# Altium footprint library En.PcbLib: 157 footprints (part 1 of 10)
Each footprint in its own frame and in the unit in brackets; x right, y up, seen from the top. Pads: shape width x height; smd on the part's side, far side on the other; paste and mask are expansions set on the pad; w line width, h text height; cw(c..) or ccw(c..) is an arc to the next point about the centre after c.
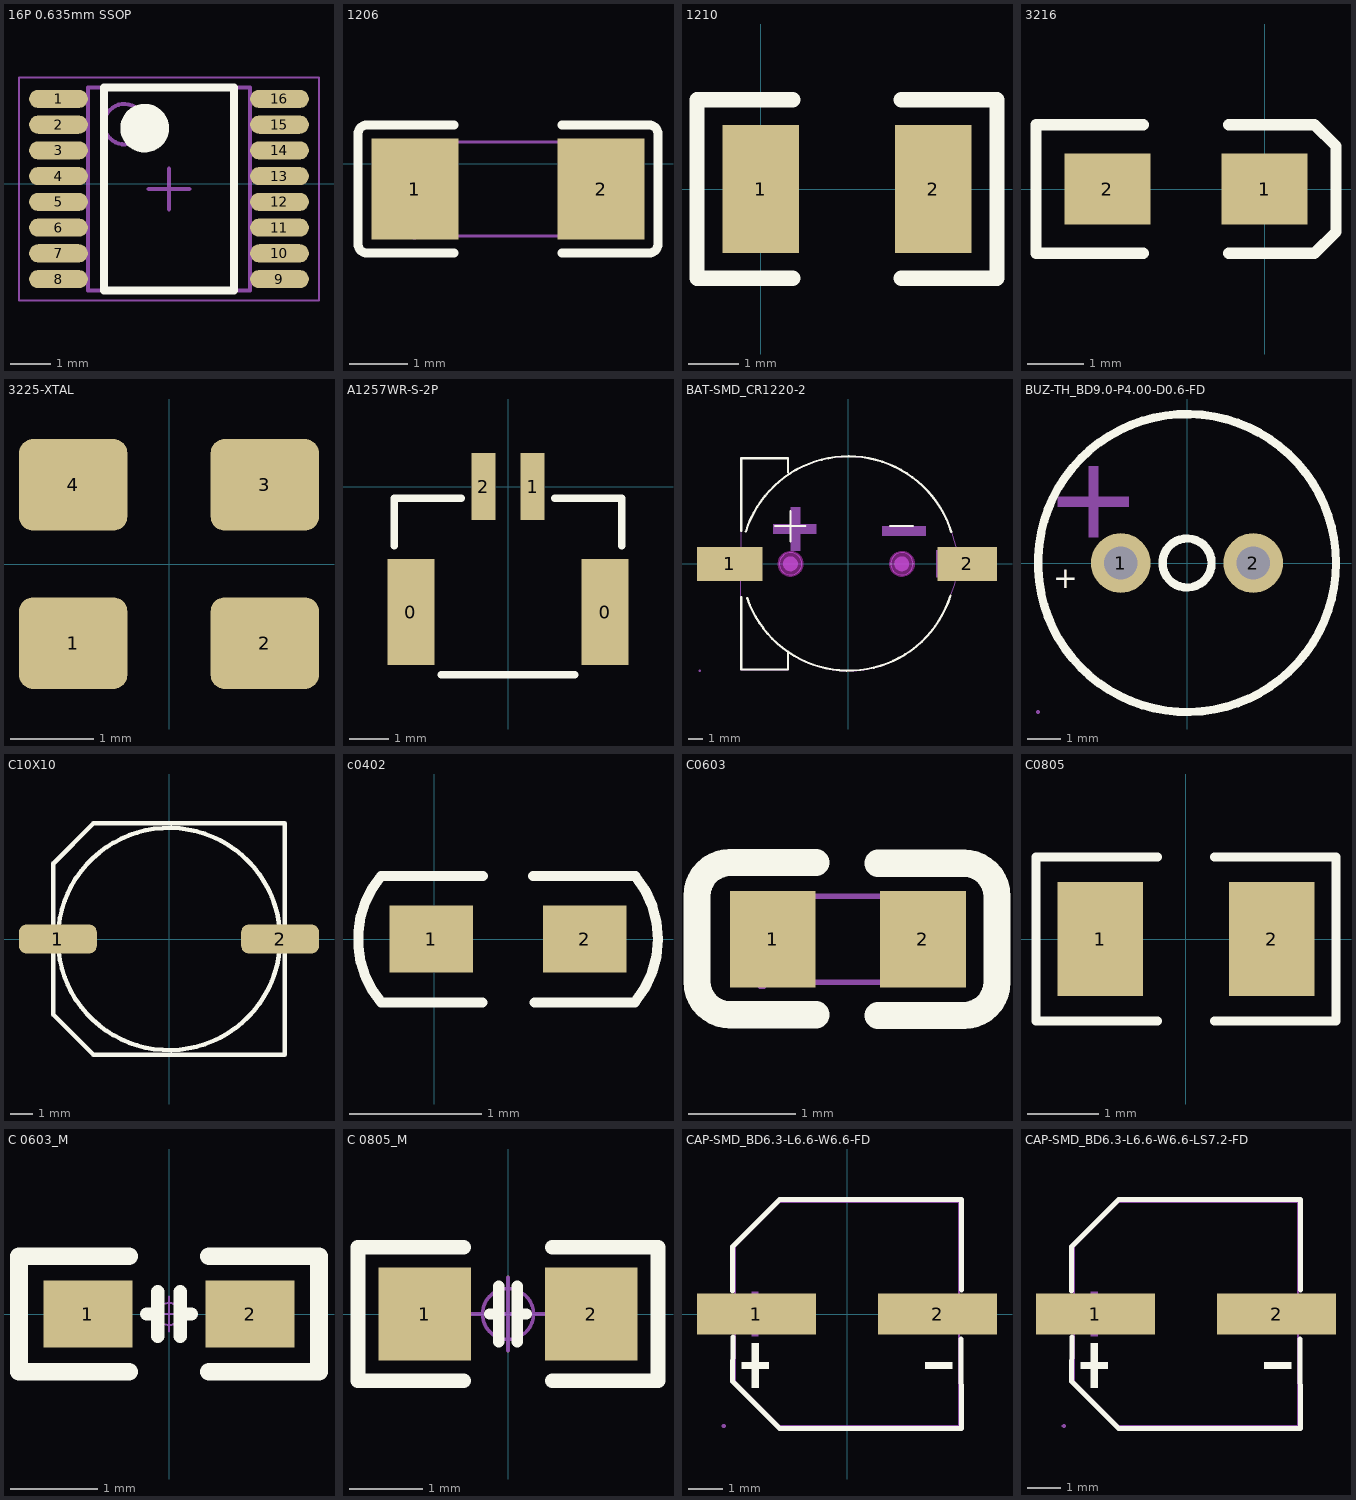
[diagram p0: the footprints below, top view; thin cyan lines are the x and y axes]

## 16P 0.635mm SSOP [mm]
pads (16):
  oval 1.45x0.45 smd: 1(43.757,2.095) 2(43.757,1.46) 3(43.757,0.826) 4(43.757,0.191) 5(43.757,-0.445) 6(43.757,-1.079) 7(43.757,-1.714) 8(43.757,-2.349) 9(49.207,-2.349) 10(49.207,-1.714) 11(49.207,-1.079) 12(49.207,-0.445) 13(49.207,0.191) 14(49.207,0.826) 15(49.207,1.46) 16(49.207,2.095)
Top Overlay:
  circle w0.6: c45.882,1.373 r0.3
  lines w0.2: 44.882,-2.627 44.882,2.373 48.082,2.373 48.082,-2.627 44.882,-2.627
Mechanical 13:
  circle w0.1: c45.382,1.473 r0.5
  lines w0.1: 44.482,-2.627 44.482,2.373 48.482,2.373 48.482,-2.627 44.482,-2.627
Mechanical 15:
  lines w0.05: 42.782,-2.877 42.782,2.623 50.182,2.623 50.182,-2.877 42.782,-2.877
  lines w0.1: 45.982,-0.127 46.982,-0.127 ; 46.482,-0.627 46.482,0.373
3D body "User Library-SSOP16.SLDPRT": height 1.08, standoff -0.02, extent 43.485,-2.616 49.479,2.362

## 1206 [mm]
pads (2):
  rect 1.485x1.728 smd paste-100 mask+0.051: 1(13.417,-0.431) 2(16.602,-0.431)
Top Overlay:
  lines w0.152: 14.083,-1.524 12.598,-1.524 cw(c12.598,-1.372) 12.446,-1.372 12.446,0.509 cw(c12.598,0.509) 12.598,0.661 14.083,0.661 ; 15.936,-1.524 17.421,-1.524 ccw(c17.421,-1.372) 17.573,-1.372 17.573,0.509 ccw(c17.421,0.509) 17.421,0.661 15.936,0.661
Top Paste:
  region: 15.86,-1.195 15.86,-0.825 15.96,-0.725 16.265,-0.725 16.365,-0.625 16.365,-0.238 16.265,-0.138 15.96,-0.138 15.86,-0.038 15.86,0.333 15.96,0.433 17.245,0.433 17.345,0.333 17.345,-1.195 17.245,-1.295 15.96,-1.295
  region: 14.16,-1.195 14.16,-0.825 14.06,-0.725 13.755,-0.725 13.655,-0.625 13.655,-0.238 13.755,-0.138 14.06,-0.138 14.16,-0.038 14.16,0.333 14.06,0.433 12.775,0.433 12.675,0.333 12.675,-1.195 12.775,-1.295 14.06,-1.295
Mechanical 15:
  region: 13.47,-1.231 13.469,-1.207 13.434,-1.173 13.385,-1.173 13.35,-1.207 13.35,-1.231 13.35,-1.256 13.385,-1.29 13.434,-1.29 13.469,-1.256
  region: 13.41,-1.231 13.41,0.369 13.91,0.369 13.91,-1.231
  region: 16.61,-1.231 16.61,0.369 16.11,0.369 16.11,-1.231
  lines w0.051: 13.41,-1.231 13.41,0.369 16.61,0.369 16.61,-1.231 13.41,-1.231
3D body "User Library-C1206-1.sldprt": height 1.11, standoff -0.01, extent 13.411,-1.242 16.611,0.378

## 1210 [mil]
pads (2):
  rect 60x100 smd: 1(0,0) 2(135,0)
Top Overlay:
  lines w12: 25,-70 -50,-70 -50,70 25,70 ; 110,-70 185,-70 185,70 110,70
3D body "User Library-SMD CAPACITOR.sldprt": height 30.35, standoff -0.35, extent 4.01,-49.21 129.99,49.21

## 3216 [mil]
pads (2):
  rect 60x50 smd: 1(0,0) 2(-110,0)
Top Overlay:
  lines w7.87: -85,-45 -160,-45 -160,45 -85,45 ; -25,-45 35,-45 50,-30 50,30 35,45 -25,45
3D body "User Library-AVX_ACASE.STEP": height 67.32, standoff 0, extent -121.93,-31.14 11.93,35

## 3225-XTAL [mm]
height 1.75
pads (4):
  rrect30% 1.3x1.1 smd: 1(-1.15,-0.95) 2(1.15,-0.95) 3(1.15,0.95) 4(-1.15,0.95)
3D body "3225-XTAL.step": height 0.61, standoff 0, extent -1.6,-1.25 1.6,1.25

## A1257WR-S-2P [mm]
pads (4):
  rect 1.2x2.7 smd: 0(-2.475,-3.2) 0(2.475,-3.2)
  rect 0.6x1.7 smd: 1(0.625,0) 2(-0.625,0)
Top Overlay:
  lines w0.2: -2.9,-1.5 -2.9,-0.3 -1.2,-0.3 ; -1.7,-4.8 1.7,-4.8 ; 1.2,-0.3 2.9,-0.3 2.9,-1.5
3D body "GH1.25-WT-2P.stp": height 4.26, standoff 0, extent -2.874,-4.656 2.874,0.203

## BAT-SMD_CR1220-2 [mm]
pads (2):
  rect 4.4x2.3 smd paste+0 mask+0.05: 1(-8,0)
  rect 4x2.3 smd paste+0 mask+0.05: 2(8,0)
Top Overlay:
  lines w0.15: -7.22,-2.231 -7.22,-7.112 -4.064,-7.112 -4.064,-5.912 ; -7.22,2.231 -7.22,7.112 -4.064,7.112 -4.064,6.171 ; -6.911,2.175 cw(c0,0) 6.918,2.154 ; -6.815,-2.297 ccw(c0,0) 6.871,-2.124 ; -4.928,2.54 -2.896,2.54 ; -3.912,1.524 -3.912,3.556 ; 2.819,2.54 4.343,2.54
Keep-Out Layer:
  board cut-out: -3.15,0 -3.151,0.098 -3.204,0.287 -3.303,0.456 -3.442,0.594 -3.612,0.691 -3.802,0.741 -3.998,0.741 -4.187,0.691 -4.357,0.594 -4.497,0.456 -4.596,0.287 -4.649,0.098 -4.65,0 -4.649,-0.098 -4.596,-0.287 -4.497,-0.456 -4.357,-0.594 -4.187,-0.691 -3.998,-0.741 -3.802,-0.741 -3.612,-0.691 -3.442,-0.594 -3.303,-0.456 -3.204,-0.287 -3.151,-0.098
  board cut-out: 4.35,0 4.349,0.098 4.296,0.287 4.197,0.456 4.058,0.594 3.887,0.691 3.698,0.741 3.502,0.741 3.313,0.691 3.142,0.594 3.003,0.456 2.904,0.287 2.851,0.098 2.85,0 2.851,-0.098 2.904,-0.287 3.003,-0.456 3.142,-0.594 3.313,-0.691 3.502,-0.741 3.698,-0.741 3.887,-0.691 4.058,-0.594 4.197,-0.456 4.296,-0.287 4.349,-0.098
Mechanical 1:
  circle w0.025: c-3.9,0 r0.75
  circle w0.025: c3.6,0 r0.75
Mechanical 6:
  circle w0.5: c-3.912,0 r0.25
  circle w0.5: c3.581,0 r0.25
  region: 2.271,2.516 5.192,2.516 5.192,1.881 2.271,1.881
  region: -3.898,0.873 -3.898,3.794 -3.263,3.794 -3.263,0.873
  region: -5.08,2.667 -2.159,2.667 -2.159,2.032 -5.08,2.032
Mechanical 15:
  region: -10.02,0.9 -6.62,0.9 -6.62,-0.9 -10.02,-0.9
  region: 9.32,-0.9 5.92,-0.9 5.92,0.9 9.32,0.9
  region: -9.96,-7.206 -9.96,-7.181 -9.995,-7.146 -10.045,-7.146 -10.08,-7.181 -10.08,-7.206 -10.08,-7.231 -10.045,-7.266 -9.995,-7.266 -9.96,-7.231
  lines w0.051: -7.227,7.142 -7.227,-0.511 -7.239,-0.523 -7.239,-7.127 -4.064,-7.127 -4.064,-5.857 -4.04,-5.967 -3.896,-6.049 -3.645,-6.212 -3.131,-6.487 -2.614,-6.711 -2.092,-6.898 -1.568,-7.029 -1.045,-7.132 -0.521,-7.188 0.003,-7.206 0.544,-7.183 1.092,-7.119 2.165,-6.879 3.118,-6.481 3.59,-6.24 4.033,-5.951 4.359,-5.715 4.665,-5.454 4.979,-5.172 5.277,-4.874 5.559,-4.55 5.813,-4.226 6.281,-3.543 6.681,-2.672 6.986,-1.838 7.156,-1.399 7.258,-0.92 7.334,-0.461 7.382,-0.006 7.344,0.515 7.241,1.031 6.938,2.064 6.671,2.831 6.281,3.597 5.711,4.465 5.066,5.174 4.691,5.512 4.304,5.829 3.437,6.38 2.616,6.754 2.202,6.897 1.772,7.015 1.359,7.11 0.92,7.185 0.047,7.243 -0.43,7.221 -0.913,7.183 -1.372,7.108 -1.822,7.001 -2.26,6.874 -2.705,6.719 -3.533,6.328 -3.737,6.213 -3.892,6.12 -4.034,6.026 -4.029,6.158 -4.029,7.138 -4.025,7.143 -7.227,7.143 ; -7.227,7.142 -7.227,7.143
Multi-Layer keep-out:
  circle w0.254: c-3.9,0 r0.75
  circle w0.254: c3.6,0 r0.75
3D body "cr1220-2.step": height 4.05, standoff -0.85, extent -10.34,-7.45 9.416,7.45

## BUZ-TH_BD9.0-P4.00-D0.6-FD [mm]
pads (2):
  round 1.8 hole 1: 1(-2,0) 2(2,0)
Top Overlay:
  circle w0.254: c0,0 r0.741
  circle w0.254: c0,0 r4.5
  text "+" at -4.04,-0.769 h0.65
Mechanical 6:
  region: -2.975,0.779 -2.975,2.919 -2.685,2.919 -2.685,0.779
  region: -3.9,1.995 -1.76,1.995 -1.76,1.705 -3.9,1.705
Mechanical 15:
  region: 2.3,0 2.299,0.059 2.252,0.167 2.168,0.25 2.059,0.294 1.941,0.294 1.832,0.25 1.748,0.167 1.701,0.059 1.7,0 1.701,-0.059 1.748,-0.167 1.832,-0.25 1.941,-0.294 2.059,-0.294 2.168,-0.25 2.252,-0.167 2.299,-0.059
  region: -1.7,0 -1.701,0.059 -1.748,0.167 -1.832,0.25 -1.941,0.294 -2.059,0.294 -2.168,0.25 -2.252,0.167 -2.299,0.059 -2.3,0 -2.299,-0.059 -2.252,-0.167 -2.168,-0.25 -2.059,-0.294 -1.941,-0.294 -1.832,-0.25 -1.748,-0.167 -1.701,-0.059
  region: -4.441,-4.5 -4.441,-4.475 -4.476,-4.44 -4.526,-4.44 -4.561,-4.475 -4.561,-4.5 -4.561,-4.525 -4.526,-4.56 -4.476,-4.56 -4.441,-4.525
  lines w0.051: -0.003,-4.5 cw(c-0.001,0) 0,-4.5 -0.003,-4.5
3D body "User Library-Buzzer_9mm_Membran.sldprt": height 0, standoff -0.2, extent -2.5,-2.497 2.5,2.497
3D body "User Library-Buzzer_9mm_Fillet003.sldprt": height -0.43, standoff -6.03, extent -4.677,-4.677 4.423,4.423
3D body "User Library-Buzzer_9mm_Pin_-.sldprt": height 4.4, standoff 0, extent 1.732,-0.3 2.332,0.3
3D body "User Library-Buzzer_9mm_Pin_+.sldprt": height 5.4, standoff 0, extent -2.332,-0.3 -1.732,0.3

## C10X10 [mm]
pads (2):
  rrect50% 3.5x1.3 smd: 1(-5,0) 2(5,0)
Top Overlay:
  circle w0.2: c0,0 r5
  lines w0.2: -5.2,3.404 -5.2,-3.404 -3.404,-5.2 5.2,-5.2 5.2,5.2 -3.404,5.2 -5.191,3.413
3D body "SW3dPS-capacitor size G.STEP": height 10.21, standoff -0.01, extent -5.775,-5.118 5.825,5.182

## c0402 [mil]
pads (2):
  rect 25x20 smd: 1(-1,0) 2(45,0)
Top Overlay:
  lines w3: -15.94,-18.95 cw(c6.42,-0.05) -15.95,18.84 ; -15.68,-19 14.37,-19 ; -15.68,18.84 14.51,18.84 ; 29.51,18.83 60.08,18.83 ; 29.89,-19 59.95,-19 ; 59.95,-18.84 ccw(c37.58,0.05) 60.13,18.72
3D body "cap_0402.STEP": height 19.68, standoff 0, extent 2.31,-10 41.69,9.69

## C0603 [mm]
pads (2):
  rect 0.8x0.9 smd: 1(14.929,2.234) 2(16.33,2.234)
Top Overlay:
  lines w0.254: 15.334,1.53 14.534,1.53 cw(c14.534,1.84) 14.224,1.84 14.224,2.64 cw(c14.534,2.64) 14.534,2.949 15.334,2.949 ; 15.91,1.524 16.71,1.524 ccw(c16.71,1.834) 17.02,1.834 17.02,2.634 ccw(c16.71,2.634) 16.71,2.944 15.91,2.944
Mechanical 15:
  region: 14.83,1.834 14.83,2.634 15.13,2.634 15.13,1.834
  region: 16.43,1.834 16.43,2.634 16.13,2.634 16.13,1.834
  region: 14.889,1.834 14.889,1.859 14.854,1.894 14.804,1.894 14.769,1.859 14.769,1.834 14.769,1.809 14.805,1.774 14.854,1.774 14.889,1.809
  lines w0.051: 14.83,1.834 14.83,2.634 16.43,2.634 16.43,1.834 14.83,1.834
3D body "User Library-SMD CAPACITOR.sldprt": height 0.78, standoff -0.02, extent 14.821,1.835 16.421,2.635

## C0805 [mm]
pads (2):
  rect 1.2x1.6 smd: 1(-1.2,0) 2(1.2,0)
Top Overlay:
  lines w0.127: -0.4,-1.15 -2.1,-1.15 -2.1,1.15 -0.4,1.15 ; 0.4,-1.15 2.1,-1.15 2.1,1.15 0.4,1.15
3D body "Capacitor 0805 SMD.step": height 0.93, standoff -0.01, extent -1.455,-0.719 1.545,0.681

## C 0603_M [mil] "无极性贴片电容"
height 370.08
pads (2):
  rect 40x30 smd: 1(-36.5,0) 2(36.5,0)
Top Overlay:
  lines w6: -10,0 -5,0 ; -5,-10 -5,10 ; 5,-10 5,10 ; 5,0 10,0
  lines w8: -18,-26 -67.5,-26 -67.5,26 -18,26 ; 18,-26 67.5,-26 67.5,26 18,26
Mechanical 15:
  circle w1: c0,0 r5
  lines w1: -7.87,0 7.87,0 ; 0,-7.87 0,7.87
3D body "C 0603.STEP": height 31.89, standoff -0.39, extent -31.5,-16.14 31.5,16.14

## C 0805_M [mil] "无极性贴片电容"
height 19.68
pads (2):
  rect 50x50 smd: 1(-45,0) 2(45,0)
Top Overlay:
  lines w6: -10,0 -5,0 ; -5,-15 -5,15 ; 5,-15 5,15 ; 5,0 10,0
  lines w8: -24,-36 -81,-36 -81,36 -24,36 ; 24,-36 81,-36 81,36 24,36
Mechanical 15:
  circle w1.97: c0,0 r13.78
  lines w1.97: -19.68,0 19.68,0 ; 0,-19.68 0,19.68
3D body "C 0805.STEP": height 20.08, standoff -0.39, extent -39.37,-24.02 39.37,24.02

## CAP-SMD_BD6.3-L6.6-W6.6-FD [mm]
pads (2):
  rect 3.5x1.2 smd: 1(-2.67,0) 2(2.67,0)
Top Overlay:
  region: 3.102,-1.419 3.102,-1.617 2.31,-1.617 2.31,-1.419
  region: -3.102,-1.419 -3.102,-1.617 -2.31,-1.617 -2.31,-1.419
  region: -2.805,-0.858 -2.805,-2.178 -2.607,-2.178 -2.607,-0.858
  lines w0.152: -3.376,0.686 -3.376,1.98 -1.98,3.376 3.376,3.376 3.369,0.708 ; -3.362,-0.686 -3.376,-1.981 -1.981,-3.376 3.376,-3.376 3.356,-0.739
Mechanical 6:
  region: 3.102,0.099 3.102,-0.099 2.31,-0.099 2.31,0.099
  region: -3.102,0.099 -3.102,-0.099 -2.31,-0.099 -2.31,0.099
  region: -2.81,0.66 -2.81,-0.66 -2.612,-0.66 -2.612,0.66
Mechanical 15:
  region: -3.574,-3.3 -3.575,-3.276 -3.61,-3.242 -3.658,-3.242 -3.693,-3.276 -3.694,-3.3 -3.693,-3.324 -3.658,-3.358 -3.61,-3.358 -3.575,-3.324
  region: 1.067,0.325 3.667,0.325 3.667,-0.325 1.067,-0.325
  region: -3.634,0.325 -1.034,0.325 -1.034,-0.325 -3.634,-0.325
  lines w0.051: -3.3,-1.98 -1.98,-3.3 3.3,-3.3 3.3,3.3 -1.98,3.3 -3.3,1.98 -3.3,-1.98
3D body "User Library-CC0607.SLDPRT": height 8.11, standoff 0, extent -3.5,-3.3 3.5,3.3

## CAP-SMD_BD6.3-L6.6-W6.6-LS7.2-FD [mm]
pads (2):
  rect 3.5x1.2 smd: 1(10.284,-8.636) 2(15.624,-8.636)
Top Overlay:
  region: 10.149,-9.494 10.149,-10.814 10.347,-10.814 10.347,-9.494
  region: 9.852,-10.055 9.852,-10.253 10.644,-10.253 10.644,-10.055
  region: 16.056,-10.055 16.056,-10.253 15.264,-10.253 15.264,-10.055
  lines w0.152: 9.578,-7.95 9.578,-6.656 10.974,-5.26 16.33,-5.26 16.323,-7.928 ; 9.592,-9.322 9.578,-10.617 10.973,-12.012 16.33,-12.012 16.31,-9.375
Mechanical 6:
  region: 10.149,-7.976 10.149,-9.296 10.347,-9.296 10.347,-7.976
  region: 9.852,-8.537 9.852,-8.735 10.644,-8.735 10.644,-8.537
  region: 16.056,-8.537 16.056,-8.735 15.264,-8.735 15.264,-8.537
Mechanical 15:
  region: 9.414,-11.936 9.413,-11.912 9.378,-11.878 9.33,-11.878 9.295,-11.912 9.294,-11.936 9.295,-11.96 9.33,-11.994 9.378,-11.994 9.413,-11.96
  region: 13.904,-8.286 16.554,-8.286 16.554,-8.986 13.904,-8.986
  region: 9.354,-8.286 12.004,-8.286 12.004,-8.986 9.354,-8.986
  lines w0.051: 9.654,-10.616 10.974,-11.936 16.254,-11.936 16.254,-5.336 10.974,-5.336 9.654,-6.656 9.654,-10.616
3D body "User Library-CAP SMD SVP 6.3x5.9__X2_041F043E0434043B043E0436043A0430_X0_.sldprt": height 1, standoff 0, extent 9.781,-11.936 16.381,-5.336
3D body "User Library-CAP SMD SVP 6.3x5.9__X2_041D043E0436043A0438_X0_.sldprt": height 0.2, standoff 0, extent 9.431,-8.986 16.731,-8.286
3D body "User Library-CAP SMD SVP 6.3x5.9__X2_041C0438043D04430441_X0_.sldprt": height 5.9, standoff 5.8, extent 13.081,-11.586 16.031,-5.686
3D body "User Library-CAP SMD SVP 6.3x5.9__X2_041A043E0440043F04430441_X0_.sldprt": height 5.9, standoff 0.4, extent 9.931,-11.786 16.231,-5.486